# Altium footprint library WR-PHD_Pin Header.PcbLib: 230 footprints (part 13 of 15)
Each footprint in its own frame and in the unit in brackets; x right, y up, seen from the top. Pads: shape width x height; smd on the part's side, far side on the other; paste and mask are expansions set on the pad; w line width, h text height; cw(c..) or ccw(c..) is an arc to the next point about the centre after c.
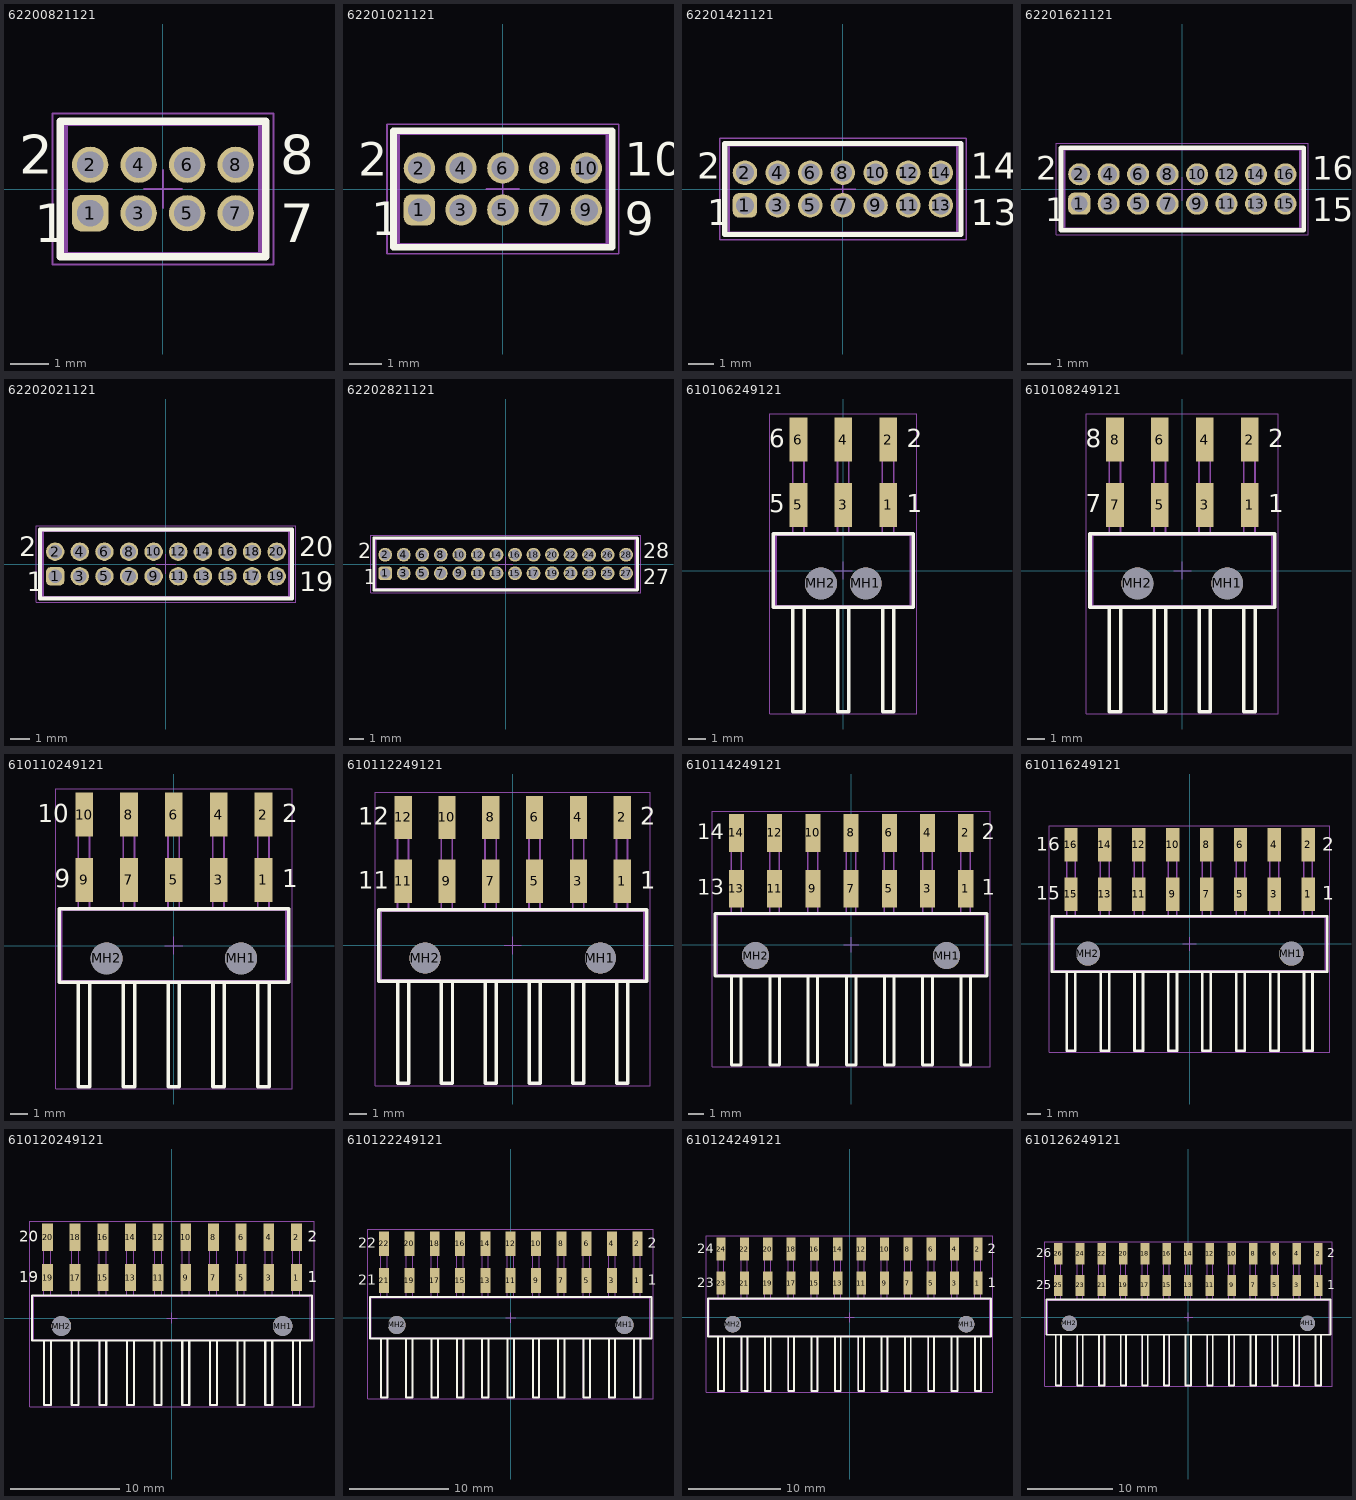
[diagram p12: the footprints below, top view; thin cyan lines are the x and y axes]

## 62200821121 [mm] "Pin Header, pitch 1.27 mm, THT, Vertical, dual row, 8p"
height 5.65
pads (8):
  rrect50% 0.95x0.95 hole 0.7: 1(-1.905,-0.635)
  round 0.95 hole 0.7: 2(-1.905,0.635) 3(-0.635,-0.635) 4(-0.635,0.635) 5(0.635,-0.635) 6(0.635,0.635) 7(1.905,-0.635) 8(1.905,0.635)
Top Overlay:
  lines w0.2: -2.69,-1.775 -2.69,1.775 2.69,1.775 2.69,-1.775 -2.69,-1.775
  text "7" at 3.07,-1.4 h1.02
  text "8" at 3.07,0.4 h1.02
  text "1" at -3.37,-1.4 h1.02
  text "2" at -3.77,0.4 h1.02
Top Designator:
  text ".Designator" at -4.998,-0.333 h1
Top Component Outline:
  lines w0.1: -2.54,-1.7 -2.54,1.7 2.54,1.7 2.54,-1.7 -2.54,-1.7
Top 3D Body:
  lines w0.1: -2.54,-1.7 -2.54,1.7 2.54,1.7 2.54,-1.7 -2.54,-1.7
Top Courtyard:
  lines w0.05: -0.5,0 0.5,0 ; 0,-0.5 0,0.5 ; -2.89,-1.975 -2.89,1.975 2.89,1.975 2.89,-1.975 -2.89,-1.975
3D body "62200821121.stp": height 5.33, standoff -2.27, extent -2.54,-1.7 2.54,1.7

## 62201021121 [mm] "Pin Header, pitch 1.27 mm, THT, Vertical, dual row, 10p"
height 5.65
pads (10):
  rrect50% 0.95x0.95 hole 0.7: 1(-2.54,-0.635)
  round 0.95 hole 0.7: 2(-2.54,0.635) 3(-1.27,-0.635) 4(-1.27,0.635) 5(0,-0.635) 6(0,0.635) 7(1.27,-0.635) 8(1.27,0.635) 9(2.54,-0.635) 10(2.54,0.635)
Top Overlay:
  lines w0.2: -3.325,-1.775 -3.325,1.775 3.325,1.775 3.325,-1.775 -3.325,-1.775
  text "9" at 3.705,-1.4 h1.02
  text "10" at 3.705,0.4 h1.02
  text "1" at -4.005,-1.4 h1.02
  text "2" at -4.405,0.4 h1.02
Top Designator:
  text ".Designator" at -5.998,-0.4 h1.2
Top Component Outline:
  lines w0.1: -3.175,-1.7 -3.175,1.7 3.175,1.7 3.175,-1.7 -3.175,-1.7
Top 3D Body:
  lines w0.1: -3.175,-1.7 -3.175,1.7 3.175,1.7 3.175,-1.7 -3.175,-1.7
Top Courtyard:
  lines w0.05: -0.5,0 0.5,0 ; 0,-0.5 0,0.5 ; -3.525,-1.975 -3.525,1.975 3.525,1.975 3.525,-1.975 -3.525,-1.975
3D body "62201021121.stp": height 5.33, standoff -2.27, extent -3.175,-1.7 3.175,1.7

## 62201421121 [mm] "Pin Header, pitch 1.27 mm, THT, Vertical, dual row, 14p"
height 5.65
pads (14):
  rrect50% 0.95x0.95 hole 0.7: 1(-3.81,-0.635)
  round 0.95 hole 0.7: 2(-3.81,0.635) 3(-2.54,-0.635) 4(-2.54,0.635) 5(-1.27,-0.635) 6(-1.27,0.635) 7(0,-0.635) 8(0,0.635) 9(1.27,-0.635) 10(1.27,0.635) 11(2.54,-0.635) 12(2.54,0.635) 13(3.81,-0.635) 14(3.81,0.635)
Top Overlay:
  lines w0.2: -4.595,-1.775 4.595,-1.775 4.595,1.775 -4.595,1.775 -4.595,-1.775
  text "2" at -5.675,0.4 h1.02
  text "1" at -5.275,-1.4 h1.02
  text "14" at 4.975,0.4 h1.02
  text "13" at 4.975,-1.4 h1.02
Top Designator:
  text ".Designator" at -7.498,-0.5 h1.5
Top Component Outline:
  lines w0.1: -4.445,-1.7 4.445,-1.7 4.445,1.7 -4.445,1.7 -4.445,-1.7
Top 3D Body:
  lines w0.1: -4.445,-1.7 4.445,-1.7 4.445,1.7 -4.445,1.7 -4.445,-1.7
Top Courtyard:
  lines w0.05: -0.5,0 0.5,0 ; 0,-0.5 0,0.5 ; -4.795,-1.975 4.795,-1.975 4.795,1.975 -4.795,1.975 -4.795,-1.975
3D body "62201421121.stp": height 5.33, standoff -2.27, extent -4.445,-1.7 4.445,1.7

## 62201621121 [mm] "Pin Header, pitch 1.27 mm, THT, Vertical, dual row, 16p"
height 5.65
pads (16):
  rrect50% 0.95x0.95 hole 0.7: 1(-4.445,-0.635)
  round 0.95 hole 0.7: 2(-4.445,0.635) 3(-3.175,-0.635) 4(-3.175,0.635) 5(-1.905,-0.635) 6(-1.905,0.635) 7(-0.635,-0.635) 8(-0.635,0.635) 9(0.635,-0.635) 10(0.635,0.635) 11(1.905,-0.635) 12(1.905,0.635) 13(3.175,-0.635) 14(3.175,0.635) 15(4.445,-0.635) 16(4.445,0.635)
Top Overlay:
  lines w0.2: -5.23,-1.775 -5.23,1.775 5.23,1.775 5.23,-1.775 -5.23,-1.775
  text "1" at -5.91,-1.4 h1.02
  text "2" at -6.31,0.4 h1.02
  text "16" at 5.61,0.4 h1.02
  text "15" at 5.61,-1.4 h1.02
Top Designator:
  text ".Designator" at -7.498,-0.5 h1.5
Top Component Outline:
  lines w0.1: -5.08,-1.7 -5.08,1.7 5.08,1.7 5.08,-1.7 -5.08,-1.7
Top 3D Body:
  lines w0.1: -5.08,-1.7 -5.08,1.7 5.08,1.7 5.08,-1.7 -5.08,-1.7
Top Courtyard:
  lines w0.05: -0.5,0 0.5,0 ; 0,-0.5 0,0.5 ; -5.43,-1.975 -5.43,1.975 5.43,1.975 5.43,-1.975 -5.43,-1.975
3D body "62201621121.stp": height 5.33, standoff -2.27, extent -5.08,-1.7 5.08,1.7

## 62202021121 [mm] "Pin Header, pitch 1.27 mm, THT, Vertical, dual row, 20p"
height 5.65
pads (20):
  rrect50% 0.95x0.95 hole 0.7: 1(-5.715,-0.635)
  round 0.95 hole 0.7: 2(-5.715,0.635) 3(-4.445,-0.635) 4(-4.445,0.635) 5(-3.175,-0.635) 6(-3.175,0.635) 7(-1.905,-0.635) 8(-1.905,0.635) 9(-0.635,-0.635) 10(-0.635,0.635) 11(0.635,-0.635) 12(0.635,0.635) 13(1.905,-0.635) 14(1.905,0.635) 15(3.175,-0.635) 16(3.175,0.635) 17(4.445,-0.635) 18(4.445,0.635) 19(5.715,-0.635) 20(5.715,0.635)
Top Overlay:
  lines w0.2: -6.5,-1.775 -6.5,1.775 6.5,1.775 6.5,-1.775 -6.5,-1.775
  text "19" at 6.88,-1.4 h1.02
  text "20" at 6.88,0.4 h1.02
  text "1" at -7.18,-1.4 h1.02
  text "2" at -7.58,0.4 h1.02
Top Designator:
  text ".Designator" at -7.498,-0.5 h1.5
Top Component Outline:
  lines w0.1: -6.35,-1.7 -6.35,1.7 6.35,1.7 6.35,-1.7 -6.35,-1.7
Top 3D Body:
  lines w0.1: -6.35,-1.7 -6.35,1.7 6.35,1.7 6.35,-1.7 -6.35,-1.7
Top Courtyard:
  lines w0.05: -0.5,0 0.5,0 ; 0,-0.5 0,0.5 ; -6.7,-1.975 -6.7,1.975 6.7,1.975 6.7,-1.975 -6.7,-1.975
3D body "62202021121.stp": height 5.33, standoff -2.27, extent -6.35,-1.7 6.35,1.7

## 62202821121 [mm] "Pin Header, pitch 1.27 mm, THT, Vertical, dual row, 28p"
height 5.65
pads (28):
  rrect50% 0.95x0.95 hole 0.7: 1(-8.255,-0.635)
  round 0.95 hole 0.7: 2(-8.255,0.635) 3(-6.985,-0.635) 4(-6.985,0.635) 5(-5.715,-0.635) 6(-5.715,0.635) 7(-4.445,-0.635) 8(-4.445,0.635) 9(-3.175,-0.635) 10(-3.175,0.635) 11(-1.905,-0.635) 12(-1.905,0.635) 13(-0.635,-0.635) 14(-0.635,0.635) 15(0.635,-0.635) 16(0.635,0.635) 17(1.905,-0.635) 18(1.905,0.635) 19(3.175,-0.635) 20(3.175,0.635) 21(4.445,-0.635) 22(4.445,0.635) 23(5.715,-0.635) 24(5.715,0.635) 25(6.985,-0.635) 26(6.985,0.635) 27(8.255,-0.635) 28(8.255,0.635)
Top Overlay:
  lines w0.2: -9.04,-1.775 -9.04,1.775 9.04,1.775 9.04,-1.775 -9.04,-1.775
  text "1" at -9.72,-1.4 h1.02
  text "2" at -10.12,0.4 h1.02
  text "28" at 9.42,0.4 h1.02
  text "27" at 9.42,-1.4 h1.02
Top Designator:
  text ".Designator" at -7.498,-0.5 h1.5
Top Component Outline:
  lines w0.1: -8.89,-1.7 -8.89,1.7 8.89,1.7 8.89,-1.7 -8.89,-1.7
Top 3D Body:
  lines w0.1: -8.89,-1.7 -8.89,1.7 8.89,1.7 8.89,-1.7 -8.89,-1.7
Top Courtyard:
  lines w0.05: -0.5,0 0.5,0 ; 0,-0.5 0,0.5 ; -9.24,-1.975 -9.24,1.975 9.24,1.975 9.24,-1.975 -9.24,-1.975
3D body "62202821121.stp": height 5.33, standoff -2.27, extent -8.89,-1.7 8.89,1.7

## 610106249121 [mm] "Pin Header, pitch 2.54 mm, SMD, Angled, dual row, 6p"
height 5.08
pads (8):
  rect 1x2.5 smd: 1(2.54,3.72) 2(2.54,7.42) 3(0,3.72) 4(0,7.42) 5(-2.54,3.72) 6(-2.54,7.42)
  round 1.8 hole 1.8 unplated: MH1(1.27,-0.73) MH2(-1.27,-0.73)
Top Overlay:
  lines w0.2: -2.86,-2.075 -2.86,-8 -2.22,-8 -2.22,-2.075 ; -0.32,-2.075 -0.32,-8 0.32,-8 0.32,-2.075 ; 2.22,-2.075 2.22,-8 2.86,-8 2.86,-2.075 ; -3.96,-2.075 -3.96,2.075 3.96,2.075 3.96,-2.075 -3.96,-2.075
  text "6" at -4.2,7 h1.02
  text "5" at -4.2,3.3 h1.02
  text "2" at 3.6,7 h1.02
  text "1" at 3.6,3.3 h1.02
Top Designator:
  text ".Designator" at -7.498,-0.5 h1.5
Top Component Outline:
  lines w0.1: -2.87,2 -2.87,8.16 ; -2.87,4.135 -2.87,4.26 ; -2.87,4.48 -2.23,4.48 ; -2.87,7.535 -2.87,7.815 -2.87,8.16 ; -2.86,-2 -2.86,-8 -2.22,-8 -2.22,-2 ; -2.23,2 -2.23,8.16 ; -2.23,4.135 -2.23,4.26 ; -2.23,7.535 -2.23,7.815 -2.23,8.16 ; -0.33,2 -0.33,8.16 ; -0.33,4.135 -0.33,4.26 ; -0.33,4.48 0.31,4.48 ; -0.33,7.535 -0.33,7.815 -0.33,8.16 ; -0.32,-2 -0.32,-8 0.32,-8 0.32,-2 ; 0.31,2 0.31,8.16 ; 0.31,4.135 0.31,4.26 ; 0.31,7.535 0.31,7.815 0.31,8.16 ; 2.21,2 2.21,8.16 ; 2.21,4.135 2.21,4.26 ; 2.21,4.48 2.85,4.48 ; 2.21,7.535 2.21,7.815 2.21,8.16 ; 2.22,-2 2.22,-8 2.86,-8 2.86,-2 ; 2.85,2 2.85,8.16 ; 2.85,4.135 2.85,4.26 ; 2.85,7.535 2.85,7.815 2.85,8.16 ; -2.87,8.16 -2.23,8.16 ; -0.33,8.16 0.31,8.16 ; 2.21,8.16 2.85,8.16 ; -3.81,-2 3.81,-2 3.81,2 -3.81,2 -3.81,-2
Top 3D Body:
  lines w0.1: -2.87,2 -2.87,8.16 ; -2.87,4.135 -2.87,4.26 ; -2.87,4.48 -2.23,4.48 ; -2.87,7.535 -2.87,7.815 -2.87,8.16 ; -2.86,-2 -2.86,-8 -2.22,-8 -2.22,-2 ; -2.23,2 -2.23,8.16 ; -2.23,4.135 -2.23,4.26 ; -2.23,7.535 -2.23,7.815 -2.23,8.16 ; -0.33,2 -0.33,8.16 ; -0.33,4.135 -0.33,4.26 ; -0.33,4.48 0.31,4.48 ; -0.33,7.535 -0.33,7.815 -0.33,8.16 ; -0.32,-2 -0.32,-8 0.32,-8 0.32,-2 ; 0.31,2 0.31,8.16 ; 0.31,4.135 0.31,4.26 ; 0.31,7.535 0.31,7.815 0.31,8.16 ; 2.21,2 2.21,8.16 ; 2.21,4.135 2.21,4.26 ; 2.21,4.48 2.85,4.48 ; 2.21,7.535 2.21,7.815 2.21,8.16 ; 2.22,-2 2.22,-8 2.86,-8 2.86,-2 ; 2.85,2 2.85,8.16 ; 2.85,4.135 2.85,4.26 ; 2.85,7.535 2.85,7.815 2.85,8.16 ; -2.87,8.16 -2.23,8.16 ; -0.33,8.16 0.31,8.16 ; 2.21,8.16 2.85,8.16 ; -3.81,-2 3.81,-2 3.81,2 -3.81,2 -3.81,-2
Top Courtyard:
  lines w0.05: -0.5,0 0.5,0 ; 0,-0.5 0,0.5 ; -4.16,-8.125 -4.16,8.87 4.16,8.87 4.16,-8.125 -4.16,-8.125
3D body "610106249121.stp": height 5.1, standoff -1.38, extent -3.81,-8 3.81,8.16

## 610108249121 [mm] "Pin Header, pitch 2.54 mm, SMD, Angled, dual row, 8p"
height 5.08
pads (10):
  rect 1x2.5 smd: 1(3.81,3.72) 2(3.81,7.42) 3(1.27,3.72) 4(1.27,7.42) 5(-1.27,3.72) 6(-1.27,7.42) 7(-3.81,3.72) 8(-3.81,7.42)
  round 1.8 hole 1.8 unplated: MH1(2.54,-0.73) MH2(-2.54,-0.73)
Top Overlay:
  lines w0.2: -4.13,-2.075 -4.13,-8 -3.49,-8 -3.49,-2.075 ; -1.59,-2.075 -1.59,-8 -0.95,-8 -0.95,-2.075 ; 0.95,-2.075 0.95,-8 1.59,-8 1.59,-2.075 ; 3.49,-2.075 3.49,-8 4.13,-8 4.13,-2.075 ; -5.23,-2.075 -5.23,2.075 5.23,2.075 5.23,-2.075 -5.23,-2.075
  text "2" at 4.87,7 h1.02
  text "1" at 4.87,3.3 h1.02
  text "8" at -5.47,7 h1.02
  text "7" at -5.47,3.3 h1.02
Top Designator:
  text ".Designator" at -7.498,-0.5 h1.5
Top Component Outline:
  lines w0.1: -4.14,2 -4.14,8.16 ; -4.14,4.135 -4.14,4.26 ; -4.14,4.48 -3.5,4.48 ; -4.14,7.535 -4.14,7.815 -4.14,8.16 ; -4.13,-2 -4.13,-8 -3.49,-8 -3.49,-2 ; -3.5,2 -3.5,8.16 ; -3.5,4.135 -3.5,4.26 ; -3.5,7.535 -3.5,7.815 -3.5,8.16 ; -1.6,2 -1.6,8.16 ; -1.6,4.135 -1.6,4.26 ; -1.6,4.48 -0.96,4.48 ; -1.6,7.535 -1.6,7.815 -1.6,8.16 ; -1.59,-2 -1.59,-8 -0.95,-8 -0.95,-2 ; -0.96,2 -0.96,8.16 ; -0.96,4.135 -0.96,4.26 ; -0.96,7.535 -0.96,7.815 -0.96,8.16 ; 0.94,2 0.94,8.16 ; 0.94,4.135 0.94,4.26 ; 0.94,4.48 1.58,4.48 ; 0.94,7.535 0.94,7.815 0.94,8.16 ; 0.95,-2 0.95,-8 1.59,-8 1.59,-2 ; 1.58,2 1.58,8.16 ; 1.58,4.135 1.58,4.26 ; 1.58,7.535 1.58,7.815 1.58,8.16 ; 3.48,2 3.48,8.16 ; 3.48,4.135 3.48,4.26 ; 3.48,4.48 4.12,4.48 ; 3.48,7.535 3.48,7.815 3.48,8.16 ; 3.49,-2 3.49,-8 4.13,-8 4.13,-2 ; 4.12,2 4.12,8.16 ; 4.12,4.135 4.12,4.26 ; 4.12,7.535 4.12,7.815 4.12,8.16 ; -4.14,8.16 -3.5,8.16 ; -1.6,8.16 -0.96,8.16 ; 0.94,8.16 1.58,8.16 ; 3.48,8.16 4.12,8.16 ; -5.08,-2 -5.08,2 5.08,2 5.08,-2 -5.08,-2
Top 3D Body:
  lines w0.1: -4.14,2 -4.14,8.16 ; -4.14,4.135 -4.14,4.26 ; -4.14,4.48 -3.5,4.48 ; -4.14,7.535 -4.14,7.815 -4.14,8.16 ; -4.13,-2 -4.13,-8 -3.49,-8 -3.49,-2 ; -3.5,2 -3.5,8.16 ; -3.5,4.135 -3.5,4.26 ; -3.5,7.535 -3.5,7.815 -3.5,8.16 ; -1.6,2 -1.6,8.16 ; -1.6,4.135 -1.6,4.26 ; -1.6,4.48 -0.96,4.48 ; -1.6,7.535 -1.6,7.815 -1.6,8.16 ; -1.59,-2 -1.59,-8 -0.95,-8 -0.95,-2 ; -0.96,2 -0.96,8.16 ; -0.96,4.135 -0.96,4.26 ; -0.96,7.535 -0.96,7.815 -0.96,8.16 ; 0.94,2 0.94,8.16 ; 0.94,4.135 0.94,4.26 ; 0.94,4.48 1.58,4.48 ; 0.94,7.535 0.94,7.815 0.94,8.16 ; 0.95,-2 0.95,-8 1.59,-8 1.59,-2 ; 1.58,2 1.58,8.16 ; 1.58,4.135 1.58,4.26 ; 1.58,7.535 1.58,7.815 1.58,8.16 ; 3.48,2 3.48,8.16 ; 3.48,4.135 3.48,4.26 ; 3.48,4.48 4.12,4.48 ; 3.48,7.535 3.48,7.815 3.48,8.16 ; 3.49,-2 3.49,-8 4.13,-8 4.13,-2 ; 4.12,2 4.12,8.16 ; 4.12,4.135 4.12,4.26 ; 4.12,7.535 4.12,7.815 4.12,8.16 ; -4.14,8.16 -3.5,8.16 ; -1.6,8.16 -0.96,8.16 ; 0.94,8.16 1.58,8.16 ; 3.48,8.16 4.12,8.16 ; -5.08,-2 -5.08,2 5.08,2 5.08,-2 -5.08,-2
Top Courtyard:
  lines w0.05: -0.5,0 0.5,0 ; 0,-0.5 0,0.5 ; -5.43,-8.125 -5.43,8.87 5.43,8.87 5.43,-8.125 -5.43,-8.125
3D body "610108249121.stp": height 5.1, standoff -1.38, extent -5.08,-8 5.08,8.16

## 610110249121 [mm] "Pin Header, pitch 2.54 mm, SMD, Angled, dual row, 10p"
height 5.08
pads (12):
  rect 1x2.5 smd: 1(5.08,3.72) 2(5.08,7.42) 3(2.54,3.72) 4(2.54,7.42) 5(0,3.72) 6(0,7.42) 7(-2.54,3.72) 8(-2.54,7.42) 9(-5.08,3.72) 10(-5.08,7.42)
  round 1.8 hole 1.8 unplated: MH1(3.81,-0.73) MH2(-3.81,-0.73)
Top Overlay:
  lines w0.2: -5.4,-2.075 -5.4,-8 -4.76,-8 -4.76,-2.075 ; -2.86,-2.075 -2.86,-8 -2.22,-8 -2.22,-2.075 ; -0.32,-2.075 -0.32,-8 0.32,-8 0.32,-2.075 ; 2.22,-2.075 2.22,-8 2.86,-8 2.86,-2.075 ; 4.76,-2.075 4.76,-8 5.4,-8 5.4,-2.075 ; -6.5,-2.075 6.5,-2.075 6.5,2.075 -6.5,2.075 -6.5,-2.075
  text "1" at 6.14,3.3 h1.02
  text "2" at 6.14,7 h1.02
  text "10" at -7.7,7 h1.02
  text "9" at -6.74,3.3 h1.02
Top Designator:
  text ".Designator" at -7.498,-0.5 h1.5
Top Component Outline:
  lines w0.1: -5.41,2 -5.41,8.16 ; -5.41,4.135 -5.41,4.26 ; -5.41,4.48 -4.77,4.48 ; -5.41,7.535 -5.41,7.815 -5.41,8.16 ; -5.4,-2 -5.4,-8 -4.76,-8 -4.76,-2 ; -4.77,2 -4.77,8.16 ; -4.77,4.135 -4.77,4.26 ; -4.77,7.535 -4.77,7.815 -4.77,8.16 ; -2.87,2 -2.87,8.16 ; -2.87,4.135 -2.87,4.26 ; -2.87,4.48 -2.23,4.48 ; -2.87,7.535 -2.87,7.815 -2.87,8.16 ; -2.86,-2 -2.86,-8 -2.22,-8 -2.22,-2 ; -2.23,2 -2.23,8.16 ; -2.23,4.135 -2.23,4.26 ; -2.23,7.535 -2.23,7.815 -2.23,8.16 ; -0.33,2 -0.33,8.16 ; -0.33,4.135 -0.33,4.26 ; -0.33,4.48 0.31,4.48 ; -0.33,7.535 -0.33,7.815 -0.33,8.16 ; -0.32,-2 -0.32,-8 0.32,-8 0.32,-2 ; 0.31,2 0.31,8.16 ; 0.31,4.135 0.31,4.26 ; 0.31,7.535 0.31,7.815 0.31,8.16 ; 2.21,2 2.21,8.16 ; 2.21,4.135 2.21,4.26 ; 2.21,4.48 2.85,4.48 ; 2.21,7.535 2.21,7.815 2.21,8.16 ; 2.22,-2 2.22,-8 2.86,-8 2.86,-2 ; 2.85,2 2.85,8.16 ; 2.85,4.135 2.85,4.26 ; 2.85,7.535 2.85,7.815 2.85,8.16 ; 4.75,2 4.75,8.16 ; 4.75,4.135 4.75,4.26 ; 4.75,4.48 5.39,4.48 ; 4.75,7.535 4.75,7.815 4.75,8.16 ; 4.76,-2 4.76,-8 5.4,-8 5.4,-2 ; 5.39,2 5.39,8.16 ; 5.39,4.135 5.39,4.26 ; 5.39,7.535 5.39,7.815 5.39,8.16 ; -5.41,8.16 -4.77,8.16 ; -2.87,8.16 -2.23,8.16 ; -0.33,8.16 0.31,8.16 ; 2.21,8.16 2.85,8.16 ; 4.75,8.16 5.39,8.16 ; -6.35,-2 -6.35,2 6.35,2 6.35,-2 -6.35,-2
Top 3D Body:
  lines w0.1: -5.41,2 -5.41,8.16 ; -5.41,4.135 -5.41,4.26 ; -5.41,4.48 -4.77,4.48 ; -5.41,7.535 -5.41,7.815 -5.41,8.16 ; -5.4,-2 -5.4,-8 -4.76,-8 -4.76,-2 ; -4.77,2 -4.77,8.16 ; -4.77,4.135 -4.77,4.26 ; -4.77,7.535 -4.77,7.815 -4.77,8.16 ; -2.87,2 -2.87,8.16 ; -2.87,4.135 -2.87,4.26 ; -2.87,4.48 -2.23,4.48 ; -2.87,7.535 -2.87,7.815 -2.87,8.16 ; -2.86,-2 -2.86,-8 -2.22,-8 -2.22,-2 ; -2.23,2 -2.23,8.16 ; -2.23,4.135 -2.23,4.26 ; -2.23,7.535 -2.23,7.815 -2.23,8.16 ; -0.33,2 -0.33,8.16 ; -0.33,4.135 -0.33,4.26 ; -0.33,4.48 0.31,4.48 ; -0.33,7.535 -0.33,7.815 -0.33,8.16 ; -0.32,-2 -0.32,-8 0.32,-8 0.32,-2 ; 0.31,2 0.31,8.16 ; 0.31,4.135 0.31,4.26 ; 0.31,7.535 0.31,7.815 0.31,8.16 ; 2.21,2 2.21,8.16 ; 2.21,4.135 2.21,4.26 ; 2.21,4.48 2.85,4.48 ; 2.21,7.535 2.21,7.815 2.21,8.16 ; 2.22,-2 2.22,-8 2.86,-8 2.86,-2 ; 2.85,2 2.85,8.16 ; 2.85,4.135 2.85,4.26 ; 2.85,7.535 2.85,7.815 2.85,8.16 ; 4.75,2 4.75,8.16 ; 4.75,4.135 4.75,4.26 ; 4.75,4.48 5.39,4.48 ; 4.75,7.535 4.75,7.815 4.75,8.16 ; 4.76,-2 4.76,-8 5.4,-8 5.4,-2 ; 5.39,2 5.39,8.16 ; 5.39,4.135 5.39,4.26 ; 5.39,7.535 5.39,7.815 5.39,8.16 ; -5.41,8.16 -4.77,8.16 ; -2.87,8.16 -2.23,8.16 ; -0.33,8.16 0.31,8.16 ; 2.21,8.16 2.85,8.16 ; 4.75,8.16 5.39,8.16 ; -6.35,-2 -6.35,2 6.35,2 6.35,-2 -6.35,-2
Top Courtyard:
  lines w0.05: -0.5,0 0.5,0 ; 0,-0.5 0,0.5 ; -6.7,-8.125 6.7,-8.125 6.7,8.87 -6.7,8.87 -6.7,-8.125
3D body "610110249121.stp": height 5.1, standoff -1.38, extent -6.35,-8 6.35,8.16

## 610112249121 [mm] "Pin Header, pitch 2.54 mm, SMD, Angled, dual row, 12p"
height 5.08
pads (14):
  rect 1x2.5 smd: 1(6.35,3.72) 2(6.35,7.42) 3(3.81,3.72) 4(3.81,7.42) 5(1.27,3.72) 6(1.27,7.42) 7(-1.27,3.72) 8(-1.27,7.42) 9(-3.81,3.72) 10(-3.81,7.42) 11(-6.35,3.72) 12(-6.35,7.42)
  round 1.8 hole 1.8 unplated: MH1(5.08,-0.73) MH2(-5.08,-0.73)
Top Overlay:
  lines w0.2: -6.67,-2.075 -6.67,-8 -6.03,-8 -6.03,-2.075 ; -4.13,-2.075 -4.13,-8 -3.49,-8 -3.49,-2.075 ; -1.59,-2.075 -1.59,-8 -0.95,-8 -0.95,-2.075 ; 0.95,-2.075 0.95,-8 1.59,-8 1.59,-2.075 ; 3.49,-2.075 3.49,-8 4.13,-8 4.13,-2.075 ; 6.03,-2.075 6.03,-8 6.67,-8 6.67,-2.075 ; -7.77,-2.075 7.77,-2.075 7.77,2.075 -7.77,2.075 -7.77,-2.075
  text "1" at 7.41,3.3 h1.02
  text "2" at 7.41,7 h1.02
  text "11" at -8.97,3.3 h1.02
  text "12" at -8.97,7 h1.02
Top Designator:
  text ".Designator" at -7.498,-0.5 h1.5
Top Component Outline:
  lines w0.1: -6.68,2 -6.68,8.16 ; -6.68,4.135 -6.68,4.26 ; -6.68,4.48 -6.04,4.48 ; -6.68,7.535 -6.68,7.815 -6.68,8.16 ; -6.67,-2 -6.67,-8 -6.03,-8 -6.03,-2 ; -6.04,2 -6.04,8.16 ; -6.04,4.135 -6.04,4.26 ; -6.04,7.535 -6.04,7.815 -6.04,8.16 ; -4.14,2 -4.14,8.16 ; -4.14,4.135 -4.14,4.26 ; -4.14,4.48 -3.5,4.48 ; -4.14,7.535 -4.14,7.815 -4.14,8.16 ; -4.13,-2 -4.13,-8 -3.49,-8 -3.49,-2 ; -3.5,2 -3.5,8.16 ; -3.5,4.135 -3.5,4.26 ; -3.5,7.535 -3.5,7.815 -3.5,8.16 ; -1.6,2 -1.6,8.16 ; -1.6,4.135 -1.6,4.26 ; -1.6,4.48 -0.96,4.48 ; -1.6,7.535 -1.6,7.815 -1.6,8.16 ; -1.59,-2 -1.59,-8 -0.95,-8 -0.95,-2 ; -0.96,2 -0.96,8.16 ; -0.96,4.135 -0.96,4.26 ; -0.96,7.535 -0.96,7.815 -0.96,8.16 ; 0.94,2 0.94,8.16 ; 0.94,4.135 0.94,4.26 ; 0.94,4.48 1.58,4.48 ; 0.94,7.535 0.94,7.815 0.94,8.16 ; 0.95,-2 0.95,-8 1.59,-8 1.59,-2 ; 1.58,2 1.58,8.16 ; 1.58,4.135 1.58,4.26 ; 1.58,7.535 1.58,7.815 1.58,8.16 ; 3.48,2 3.48,8.16 ; 3.48,4.135 3.48,4.26 ; 3.48,4.48 4.12,4.48 ; 3.48,7.535 3.48,7.815 3.48,8.16 ; 3.49,-2 3.49,-8 4.13,-8 4.13,-2 ; 4.12,2 4.12,8.16 ; 4.12,4.135 4.12,4.26 ; 4.12,7.535 4.12,7.815 4.12,8.16 ; 6.02,2 6.02,8.16 ; 6.02,4.135 6.02,4.26 ; 6.02,4.48 6.66,4.48 ; 6.02,7.535 6.02,7.815 6.02,8.16 ; 6.03,-2 6.03,-8 6.67,-8 6.67,-2 ; 6.66,2 6.66,8.16 ; 6.66,4.135 6.66,4.26 ; 6.66,7.535 6.66,7.815 6.66,8.16 ; -6.68,8.16 -6.04,8.16 ; -4.14,8.16 -3.5,8.16 ; -1.6,8.16 -0.96,8.16 ; 0.94,8.16 1.58,8.16 ; 3.48,8.16 4.12,8.16 ; 6.02,8.16 6.66,8.16 ; -7.62,-2 -7.62,2 7.62,2 7.62,-2 -7.62,-2
Top 3D Body:
  lines w0.1: -6.68,2 -6.68,8.16 ; -6.68,4.135 -6.68,4.26 ; -6.68,4.48 -6.04,4.48 ; -6.68,7.535 -6.68,7.815 -6.68,8.16 ; -6.67,-2 -6.67,-8 -6.03,-8 -6.03,-2 ; -6.04,2 -6.04,8.16 ; -6.04,4.135 -6.04,4.26 ; -6.04,7.535 -6.04,7.815 -6.04,8.16 ; -4.14,2 -4.14,8.16 ; -4.14,4.135 -4.14,4.26 ; -4.14,4.48 -3.5,4.48 ; -4.14,7.535 -4.14,7.815 -4.14,8.16 ; -4.13,-2 -4.13,-8 -3.49,-8 -3.49,-2 ; -3.5,2 -3.5,8.16 ; -3.5,4.135 -3.5,4.26 ; -3.5,7.535 -3.5,7.815 -3.5,8.16 ; -1.6,2 -1.6,8.16 ; -1.6,4.135 -1.6,4.26 ; -1.6,4.48 -0.96,4.48 ; -1.6,7.535 -1.6,7.815 -1.6,8.16 ; -1.59,-2 -1.59,-8 -0.95,-8 -0.95,-2 ; -0.96,2 -0.96,8.16 ; -0.96,4.135 -0.96,4.26 ; -0.96,7.535 -0.96,7.815 -0.96,8.16 ; 0.94,2 0.94,8.16 ; 0.94,4.135 0.94,4.26 ; 0.94,4.48 1.58,4.48 ; 0.94,7.535 0.94,7.815 0.94,8.16 ; 0.95,-2 0.95,-8 1.59,-8 1.59,-2 ; 1.58,2 1.58,8.16 ; 1.58,4.135 1.58,4.26 ; 1.58,7.535 1.58,7.815 1.58,8.16 ; 3.48,2 3.48,8.16 ; 3.48,4.135 3.48,4.26 ; 3.48,4.48 4.12,4.48 ; 3.48,7.535 3.48,7.815 3.48,8.16 ; 3.49,-2 3.49,-8 4.13,-8 4.13,-2 ; 4.12,2 4.12,8.16 ; 4.12,4.135 4.12,4.26 ; 4.12,7.535 4.12,7.815 4.12,8.16 ; 6.02,2 6.02,8.16 ; 6.02,4.135 6.02,4.26 ; 6.02,4.48 6.66,4.48 ; 6.02,7.535 6.02,7.815 6.02,8.16 ; 6.03,-2 6.03,-8 6.67,-8 6.67,-2 ; 6.66,2 6.66,8.16 ; 6.66,4.135 6.66,4.26 ; 6.66,7.535 6.66,7.815 6.66,8.16 ; -6.68,8.16 -6.04,8.16 ; -4.14,8.16 -3.5,8.16 ; -1.6,8.16 -0.96,8.16 ; 0.94,8.16 1.58,8.16 ; 3.48,8.16 4.12,8.16 ; 6.02,8.16 6.66,8.16 ; -7.62,-2 -7.62,2 7.62,2 7.62,-2 -7.62,-2
Top Courtyard:
  lines w0.05: -0.5,0 0.5,0 ; 0,-0.5 0,0.5 ; -7.97,-8.125 7.97,-8.125 7.97,8.87 -7.97,8.87 -7.97,-8.125
3D body "610112249121.stp": height 5.1, standoff -1.38, extent -7.62,-8 7.62,8.16

## 610114249121 [mm] "Pin Header, pitch 2.54 mm, SMD, Angled, dual row, 14p"
height 5.08
pads (16):
  rect 1x2.5 smd: 1(7.62,3.72) 2(7.62,7.42) 3(5.08,3.72) 4(5.08,7.42) 5(2.54,3.72) 6(2.54,7.42) 7(0,3.72) 8(0,7.42) 9(-2.54,3.72) 10(-2.54,7.42) 11(-5.08,3.72) 12(-5.08,7.42) 13(-7.62,3.72) 14(-7.62,7.42)
  round 1.8 hole 1.8 unplated: MH1(6.35,-0.73) MH2(-6.35,-0.73)
Top Overlay:
  lines w0.2: -7.94,-2.075 -7.94,-8 -7.3,-8 -7.3,-2.075 ; -5.4,-2.075 -5.4,-8 -4.76,-8 -4.76,-2.075 ; -2.86,-2.075 -2.86,-8 -2.22,-8 -2.22,-2.075 ; -0.32,-2.075 -0.32,-8 0.32,-8 0.32,-2.075 ; 2.22,-2.075 2.22,-8 2.86,-8 2.86,-2.075 ; 4.76,-2.075 4.76,-8 5.4,-8 5.4,-2.075 ; 7.3,-2.075 7.3,-8 7.94,-8 7.94,-2.075 ; -9.04,-2.075 9.04,-2.075 9.04,2.075 -9.04,2.075 -9.04,-2.075
  text "1" at 8.68,3.3 h1.02
  text "2" at 8.68,7 h1.02
  text "14" at -10.24,7 h1.02
  text "13" at -10.24,3.3 h1.02
Top Designator:
  text ".Designator" at -7.498,-0.5 h1.5
Top Component Outline:
  lines w0.1: -7.95,2 -7.95,8.16 ; -7.95,4.135 -7.95,4.26 ; -7.95,4.48 -7.31,4.48 ; -7.95,7.535 -7.95,7.815 -7.95,8.16 ; -7.94,-2 -7.94,-8 -7.3,-8 -7.3,-2 ; -7.31,2 -7.31,8.16 ; -7.31,4.135 -7.31,4.26 ; -7.31,7.535 -7.31,7.815 -7.31,8.16 ; -5.41,2 -5.41,8.16 ; -5.41,4.135 -5.41,4.26 ; -5.41,4.48 -4.77,4.48 ; -5.41,7.535 -5.41,7.815 -5.41,8.16 ; -5.4,-2 -5.4,-8 -4.76,-8 -4.76,-2 ; -4.77,2 -4.77,8.16 ; -4.77,4.135 -4.77,4.26 ; -4.77,7.535 -4.77,7.815 -4.77,8.16 ; -2.87,2 -2.87,8.16 ; -2.87,4.135 -2.87,4.26 ; -2.87,4.48 -2.23,4.48 ; -2.87,7.535 -2.87,7.815 -2.87,8.16 ; -2.86,-2 -2.86,-8 -2.22,-8 -2.22,-2 ; -2.23,2 -2.23,8.16 ; -2.23,4.135 -2.23,4.26 ; -2.23,7.535 -2.23,7.815 -2.23,8.16 ; -0.33,2 -0.33,8.16 ; -0.33,4.135 -0.33,4.26 ; -0.33,4.48 0.31,4.48 ; -0.33,7.535 -0.33,7.815 -0.33,8.16 ; -0.32,-2 -0.32,-8 0.32,-8 0.32,-2 ; 0.31,2 0.31,8.16 ; 0.31,4.135 0.31,4.26 ; 0.31,7.535 0.31,7.815 0.31,8.16 ; 2.21,2 2.21,8.16 ; 2.21,4.135 2.21,4.26 ; 2.21,4.48 2.85,4.48 ; 2.21,7.535 2.21,7.815 2.21,8.16 ; 2.22,-2 2.22,-8 2.86,-8 2.86,-2 ; 2.85,2 2.85,8.16 ; 2.85,4.135 2.85,4.26 ; 2.85,7.535 2.85,7.815 2.85,8.16 ; 4.75,2 4.75,8.16 ; 4.75,4.135 4.75,4.26 ; 4.75,4.48 5.39,4.48 ; 4.75,7.535 4.75,7.815 4.75,8.16 ; 4.76,-2 4.76,-8 5.4,-8 5.4,-2 ; 5.39,2 5.39,8.16 ; 5.39,4.135 5.39,4.26 ; 5.39,7.535 5.39,7.815 5.39,8.16 ; 7.29,2 7.29,8.16 ; 7.29,4.135 7.29,4.26 ; 7.29,4.48 7.93,4.48 ; 7.29,7.535 7.29,7.815 7.29,8.16 ; 7.3,-2 7.3,-8 7.94,-8 7.94,-2 ; 7.93,2 7.93,8.16 ; 7.93,4.135 7.93,4.26 ; 7.93,7.535 7.93,7.815 7.93,8.16 ; -7.95,8.16 -7.31,8.16 ; -5.41,8.16 -4.77,8.16 ; -2.87,8.16 -2.23,8.16 ; -0.33,8.16 0.31,8.16 ; 2.21,8.16 2.85,8.16 ; 4.75,8.16 5.39,8.16 ; 7.29,8.16 7.93,8.16 ; -8.89,-2 -8.89,2 8.89,2 8.89,-2 -8.89,-2